# Altium footprint library Diodes.PcbLib: 67 footprints (part 3 of 5)
Each footprint in its own frame and in the unit in brackets; x right, y up, seen from the top. Pads: shape width x height; smd on the part's side, far side on the other; paste and mask are expansions set on the pad; w line width, h text height; cw(c..) or ccw(c..) is an arc to the next point about the centre after c.
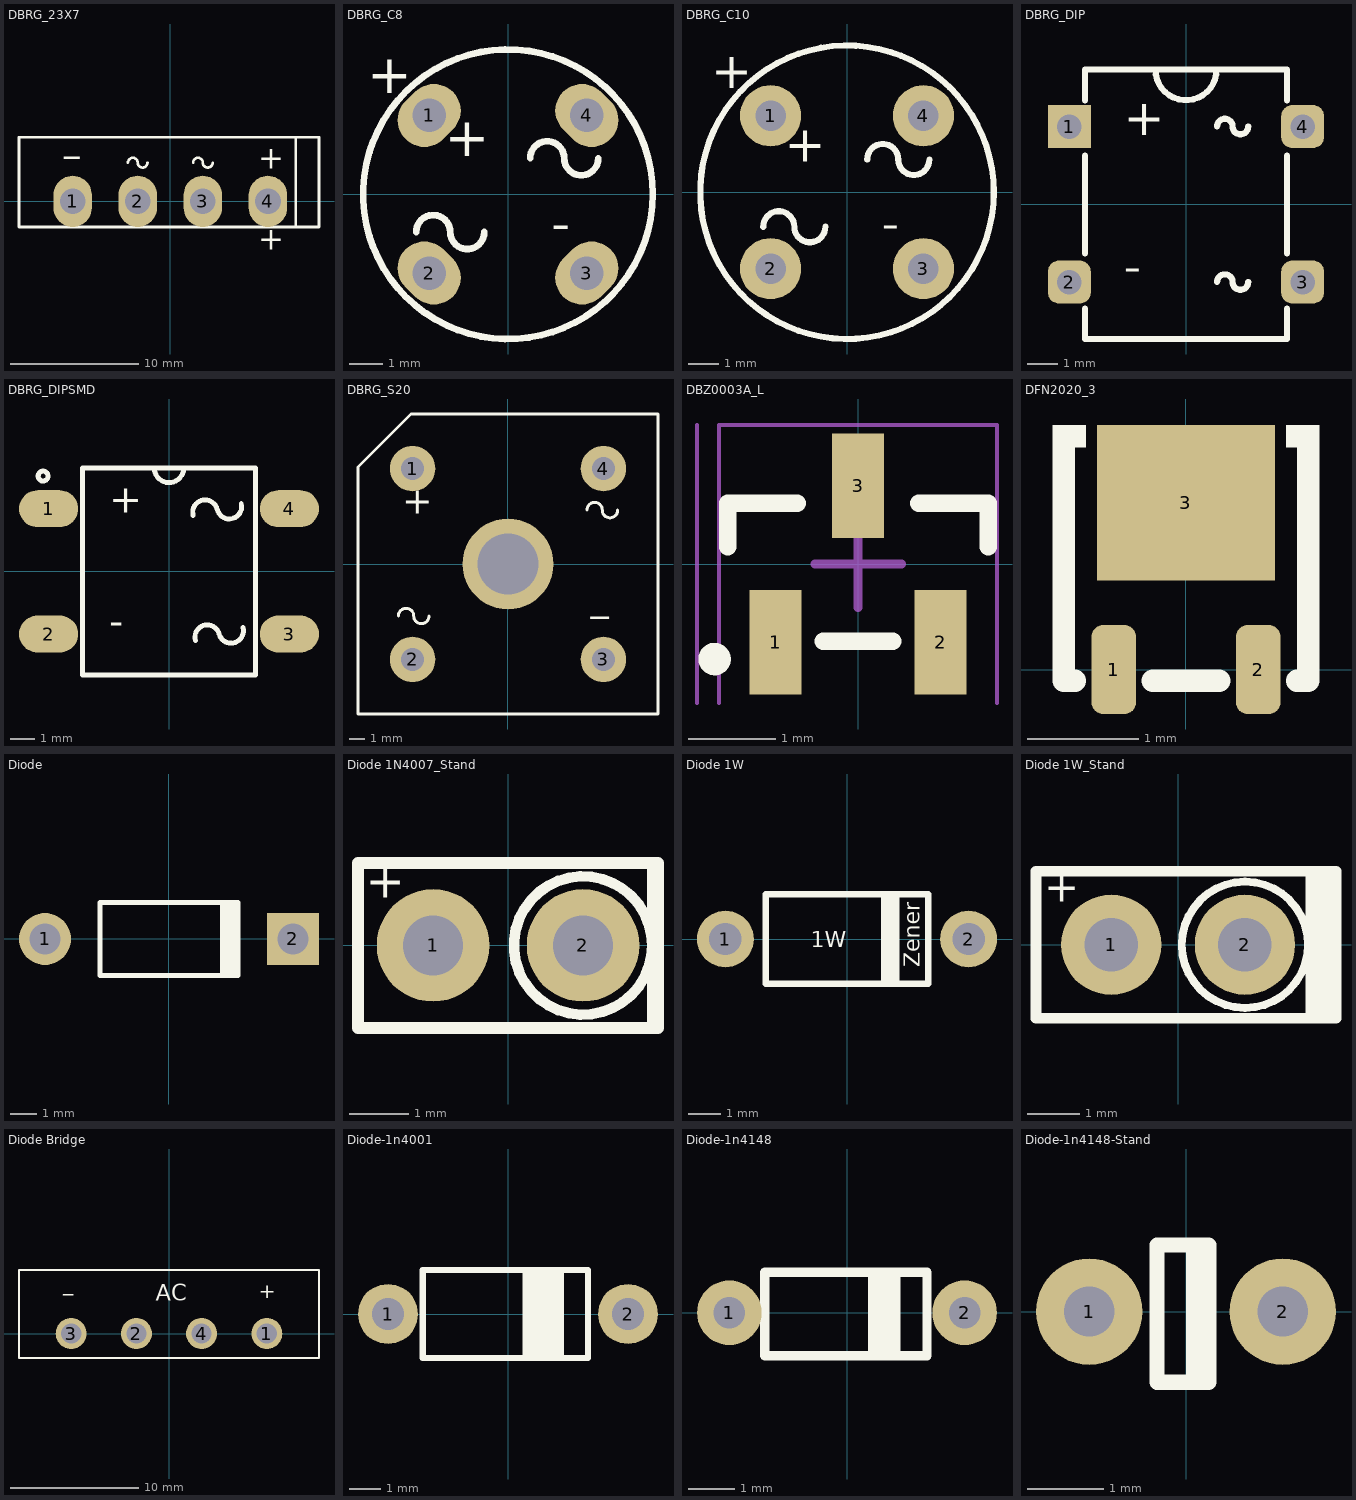
[diagram p2: the footprints below, top view; thin cyan lines are the x and y axes]

## DBRG_23X7 [mm] "BRDIGE RECTIFIER, KBU 810 pitch: 5.08mm, 23X7X19mm"
height 19
pads (4):
  oval 3x4 hole 2: 1(-7.62,0) 2(-2.54,0) 3(2.54,0) 4(7.62,0)
Top Overlay:
  lines w0.2: -3.302,3.015 cw(c-2.921,3.015) -2.54,3.015 ccw(c-2.159,3.015) -1.778,3.015 ; 1.778,3.015 cw(c2.159,3.015) 2.54,3.015 ccw(c2.921,3.015) 3.302,3.015 ; 9.8,-2 9.8,5 ; -11.8,-2 -11.8,5 11.6,5 11.6,-2 -11.8,-2
  text "+" at 6.858,-4.375 h3
  text "+" at 6.858,1.975 h3
  text "_" at -8.255,3.302 h3
3D body "KBU8M.STEP": height 19.3, standoff -4, extent -11.7,-1.91 11.5,4.95

## DBRG_C8 [mm] "BRDIGE RECTIFIER, pitch: 4.7mm, 8X8mm"
height 5.1
pads (4):
  oval 1.6x2 hole 1 rot 135: 1(-2.35,2.35) 3(2.35,-2.35)
  oval 1.6x2 hole 1 rot 45: 2(-2.35,-2.35) 4(2.35,2.35)
Top Overlay:
  circle w0.2: c0,0 r4.318
  lines w0.2: -2.739,-1.129 cw(c-2.231,-1.129) -1.723,-1.129 ccw(c-1.215,-1.129) -0.707,-1.129 ; 0.661,1.071 cw(c1.169,1.071) 1.677,1.071 ccw(c2.185,1.071) 2.693,1.071
  text "+" at -4.191,2.63 h2
  text "+" at -1.882,0.748 h2
  text "-" at 1.293,-1.789 h2
3D body "bridge.STEP": height 5.21, standoff -1.9, extent -4.05,-4.05 4.05,4.05

## DBRG_C10 [mm] "BRDIGE RECTIFIER, WOB WOG, pitch: 5.08mm, 10X10mm"
pads (4):
  round 2 hole 1: 1(-2.5,2.5) 2(-2.5,-2.5) 3(2.5,-2.5) 4(2.5,2.5)
Top Overlay:
  circle w0.2: c0,0 r4.8
  lines w0.2: -2.739,-1.129 cw(c-2.231,-1.129) -1.723,-1.129 ccw(c-1.215,-1.129) -0.707,-1.129 ; 0.661,1.071 cw(c1.169,1.071) 1.677,1.071 ccw(c2.185,1.071) 2.693,1.071
  text "-" at 1.143,-1.939 h2
  text "+" at -2.032,0.598 h2
  text "+" at -4.445,3.011 h2
3D body "User Library-WOB-1.step": height 5.6, standoff -3.5, extent -4.65,-4.65 4.65,4.65

## DBRG_DIP [mm] "BRDIGE RECTIFIER, pitch: 5.08mm, 8X5mm"
pads (4):
  rect 1.4x1.4 hole 0.8: 1(-3.81,2.54)
  rrect50% 1.4x1.4 hole 0.8: 2(-3.81,-2.54) 3(3.81,-2.54) 4(3.81,2.54)
Top Overlay:
  lines w0.2: -3.3,-3.4 -3.3,-4.4 3.3,-4.4 3.3,-3.4 ; -3.3,-1.6 -3.3,1.6 ; -3.3,3.4 -3.3,4.4 3.3,4.4 3.3,3.4 ; -1,4.4 ccw(c0,4.4) 1,4.4 ; 1.016,-2.54 cw(c1.27,-2.54) 1.524,-2.54 ccw(c1.778,-2.54) 2.032,-2.54 ; 1.016,2.54 cw(c1.27,2.54) 1.524,2.54 ccw(c1.778,2.54) 2.032,2.54 ; 3.3,-1.6 3.3,1.6
  text "-" at -2.032,-2.955 h2
  text "+" at -2.032,1.868 h2
3D body "User Library-DFM_Bridge_Rectifier.step": height 4.05, standoff -3.35, extent -4,-4.255 4,4.255

## DBRG_DIPSMD [mm] "BRIDGE RECTIFIER, pitch: 5.08mm, 8X6mm, DB-S, DF005S"
pads (4):
  oval 2.4x1.5 smd: 1(-4.88,2.54) 2(-4.88,-2.54) 3(4.88,-2.54) 4(4.88,2.54)
Top Overlay:
  circle w0.2: c-5.102,3.864 r0.2
  lines w0.2: -0.6,4.2 ccw(c0,4.2) 0.599,4.175 ; 0.979,2.268 cw(c1.462,2.398) 1.945,2.527 ; 1.066,-2.799 cw(c1.549,-2.669) 2.032,-2.54 ccw(c2.515,-2.411) 2.998,-2.281 ; 1.962,2.498 ccw(c2.445,2.627) 2.928,2.756 ; -3.5,-4.2 -3.5,4.2 3.5,4.2 3.5,-4.2 -3.5,-4.2
  text "-" at -2.413,-2.955 h2
  text "+" at -2.413,1.995 h2
3D body "User Library-PONTE-1_DF_smt.STEP": height 2.7, standoff 0, extent -5.075,-4.05 5.075,4.05

## DBRG_S20 [mm] "BRIDGE RECTIFIER, pitch: 12.7mm, 20X20mm"
pads (5):
  round 3 hole 1.5: 1(-6.3,6.3) 2(-6.3,-6.3) 3(6.3,-6.3) 4(6.3,6.3)
  round 6 hole 4: ""(0,0)
Top Overlay:
  lines w0.2: -7.239,-3.429 cw(c-6.731,-3.429) -6.223,-3.429 ccw(c-5.715,-3.429) -5.207,-3.429 ; 5.207,3.556 cw(c5.715,3.556) 6.223,3.556 ccw(c6.731,3.556) 7.239,3.556 ; -9.9,-9.9 9.9,-9.9 9.9,9.9 -6.4,9.9 -9.9,6.4 -9.9,-9.9
  text "+" at -6.985,2.737 h3
  text "_" at 5.461,-3.683 h3
3D body "User Library-BR-8.step": height 7.5, standoff -3.5, extent -9.8,-9.8 9.8,9.8

## DBZ0003A_L [mm] "SOT23, 3-Leads, Body 2.9x1.3mm, Pitch 0.95mm, Lead Span 2.4mm, IPC High Density"
height 1.12
pads (3):
  rect 0.6x1.2 smd: 1(-0.95,-0.9) 2(0.95,-0.9) 3(0,0.9)
Top Overlay:
  circle w0.2: c-1.651,-1.095 r0.086
  lines w0.2: -1.5,0.2 -1.5,0.7 -0.7,0.7 ; -0.4,-0.889 0.4,-0.889 ; 0.7,0.7 1.5,0.7 1.5,0.2
Mechanical 15:
  lines w0.05: -1.854,-1.6 -1.854,1.6 ; -1.6,-1.6 -1.6,1.6 1.6,1.6 1.6,-1.6
  lines w0.1: -0.5,0 0.5,0 ; 0,-0.5 0,0.5
3D body "DBZ0003AakaMF03A.stp": height 0.96, standoff -0.02, extent -1.46,-1.257 1.461,1.257

## DFN2020_3 [mm] "DFN2020D-3, SOT1061D, Body 2X2X0.65mm,"
height 0.65
pads (3):
  rrect50% 0.4x0.8 smd mask+0.075: 1(-0.65,0) 2(0.65,0)
  rect 1.6x1.4 smd mask+0.075: 3(0,1.5)
Top Overlay:
  region: 1.2,2.2 0.9,2.2 0.9,2 1.2,2
  rectangle: -1.2,2 -0.9,2.2
  lines w0.2: -1.1,2.1 -1.1,-0.1 -1,-0.1 ; -0.3,-0.1 0.3,-0.1 ; 1,-0.1 1.1,-0.1 1.1,2.1
3D body "User Library-SOT1061.step": height 0.65, standoff 0, extent -1,0 1,2.002

## Diode [mm] "Diode, Axial; Body 5.2 x 2.7 mm (LxDia. max), Lead Dia. 0.86 mm (max)"
height 2.8
pads (2):
  round 2 hole 1.2: 1(-4.762,0)
  rect 2x2 hole 1.2: 2(4.763,0)
Top Overlay:
  rectangle: 1.95,-1.4 2.75,1.4
  lines w0.2: 2.65,-1.4 -2.65,-1.4 -2.65,1.4 2.65,1.4
3D body "User Library-DO-41_375mil.STEP": height 2.83, standoff -2.52, extent -5.192,-1.355 5.193,1.345

## Diode 1N4007_Stand [mil]
pads (2):
  round 75 hole 40: 1(-50,0) 2(50,0)
Top Overlay:
  circle w7: c50,0 r46.1
  rectangle: 92.51,-52 100,53
  lines w7.87: -100,-55 -100,55 100,55 100,-55 -100,-55
  text "+" at -95,24.26 h39.37
3D body "1N4007_Stand.STEP": height 291.09, standoff -39.37, extent -103,-51.62 65,52.62

## Diode 1W [mil]
height 122.05
pads (2):
  round 70 hole 40: 1(-150,0) 2(150,0)
Top Overlay:
  rectangle: 42,-55 65,55
  lines w7.87: -100,-55 -100,55 100,55 100,-55 -100,-55
  text "1W" at -45,-10 h19.68
  text "Zener" at 90,-35 h19.68
3D body "Zener 1W.STEP": height 131.24, standoff -39.37, extent -166,-52.12 165,52.12

## Diode 1W_Stand [mil]
pads (2):
  round 75 hole 40: 1(-50,0) 2(50,0)
Top Overlay:
  circle w5.91: c50,0 r47.24
  rectangle: 95.47,-55 118.11,55
  lines w7.87: -106.3,-55 118.11,-55 118.11,55 -106.3,55 -106.3,-55
  text "+" at -100,24.26 h39.37
3D body "Zener 1W_Stand.STEP": height 291.09, standoff -39.37, extent -103,-51.62 65,52.62

## Diode Bridge [mil]
pads (4):
  round 95 hole 62: 1(300,0) 2(-100,0) 3(-300,0) 4(100,0)
Top Overlay:
  lines w7: -460,-75 460,-75 460,195 -460,195 -460,-75
  text "+" at 275,93.53 h78.74
  text "_" at -325,115.65 h78.74
  text "AC" at -40,100 h50
3D body "KBU8M.STEP": height 759.84, standoff -157.48, extent -455,-75 458.39,195.08

## Diode-1n4001 [mil]
pads (2):
  round 75 hole 40: 1(-150,0) 2(150,0)
Top Overlay:
  rectangle: 17.83,-59.06 70,59.06
  lines w7.87: -106.69,-55 100,-55 100,55 -106.69,55 -106.69,-55
3D body "1N4007.STEP": height 131.24, standoff -39.37, extent -166,-52.12 165,52.12

## Diode-1n4148 [mil]
pads (2):
  round 55 hole 27: 1(-100,0) 2(100,0)
Top Overlay:
  rectangle: 17.72,-36.5 45.28,34.37
  lines w7.87: -69.88,-36.5 -69.88,34.37 67.91,34.37 67.91,-36.5 -69.88,-36.5
3D body "1N4148.STEP": height 70.98, standoff -40, extent -106.5,-31.96 110.5,33

## Diode-1n4148-Stand [mil]
pads (2):
  round 55 hole 26: 1(-50,0) 2(50,0)
Top Overlay:
  rectangle: 0,-36.87 7.87,34
  lines w7.87: -15,-36.5 11.77,-36.5 11.77,34.37 -15,34.37 -15,-36.5
3D body "1N4148_Stand_V2008.STEP": height 216.61, standoff -40, extent -81.76,-32 58.98,32.96